# Altium footprint library ref-packages-longpad.PCBLIB: 1527 footprints (part 77 of 103) (continued)
## SQFP-S-14X14-100 [mm]
pads (100):
  rect 0.3x1.6 smd: 1(-6,-7.6) 2(-5.5,-7.6) 3(-5,-7.6) 4(-4.5,-7.6) 5(-4,-7.6) 6(-3.5,-7.6) 7(-3,-7.6) 8(-2.5,-7.6) 9(-2,-7.6) 10(-1.5,-7.6) 11(-1,-7.6) 12(-0.5,-7.6) 13(0,-7.6) 14(0.5,-7.6) 15(1,-7.6) 16(1.5,-7.6) 17(2,-7.6) 18(2.5,-7.6) 19(3,-7.6) 20(3.5,-7.6) 21(4,-7.6) 22(4.5,-7.6) 23(5,-7.6) 24(5.5,-7.6) 25(6,-7.6) 51(6,7.6) 52(5.5,7.6) 53(5,7.6) 54(4.5,7.6) 55(4,7.6) 56(3.5,7.6) 57(3,7.6) 58(2.5,7.6) 59(2,7.6) 60(1.5,7.6) 61(1,7.6) 62(0.5,7.6) 63(0,7.6) 64(-0.5,7.6) 65(-1,7.6) 66(-1.5,7.6) 67(-2,7.6) 68(-2.5,7.6) 69(-3,7.6) 70(-3.5,7.6) 71(-4,7.6) 72(-4.5,7.6) 73(-5,7.6) 74(-5.5,7.6) 75(-6,7.6)
  rect 1.6x0.3 smd: 26(7.6,-6) 27(7.6,-5.5) 28(7.6,-5) 29(7.6,-4.5) 30(7.6,-4) 31(7.6,-3.5) 32(7.6,-3) 33(7.6,-2.5) 34(7.6,-2) 35(7.6,-1.5) 36(7.6,-1) 37(7.6,-0.5) 38(7.6,0) 39(7.6,0.5) 40(7.6,1) 41(7.6,1.5) 42(7.6,2) 43(7.6,2.5) 44(7.6,3) 45(7.6,3.5) 46(7.6,4) 47(7.6,4.5) 48(7.6,5) 49(7.6,5.5) 50(7.6,6) 76(-7.6,6) 77(-7.6,5.5) 78(-7.6,5) 79(-7.6,4.5) 80(-7.6,4) 81(-7.6,3.5) 82(-7.6,3) 83(-7.6,2.5) 84(-7.6,2) 85(-7.6,1.5) 86(-7.6,1) 87(-7.6,0.5) 88(-7.6,0) 89(-7.6,-0.5) 90(-7.6,-1) 91(-7.6,-1.5) 92(-7.6,-2) 93(-7.6,-2.5) 94(-7.6,-3) 95(-7.6,-3.5) 96(-7.6,-4) 97(-7.6,-4.5) 98(-7.6,-5) 99(-7.6,-5.5) 100(-7.6,-6)
Top Overlay:
  circle w0.254: c-5.5,-5.5 r0.75
  lines w0.203: -6.72,-6.71 6.71,-6.71 6.71,6.71 -6.72,6.71 -6.72,-6.71
Mechanical 16:
  rectangle: -6.15,-7.9 -5.85,-6.95
  rectangle: -5.65,-7.9 -5.35,-6.95
  rectangle: -5.15,-7.9 -4.85,-6.95
  rectangle: -4.65,-7.9 -4.35,-6.95
  rectangle: -4.15,-7.9 -3.85,-6.95
  rectangle: -3.65,-7.9 -3.35,-6.95
  rectangle: -3.15,-7.9 -2.85,-6.95
  rectangle: -2.65,-7.9 -2.35,-6.95
  rectangle: -2.15,-7.9 -1.85,-6.95
  rectangle: -1.65,-7.9 -1.35,-6.95
  rectangle: -1.15,-7.9 -0.85,-6.95
  rectangle: -0.65,-7.9 -0.35,-6.95
  rectangle: -0.15,-7.9 0.15,-6.95
  rectangle: 0.35,-7.9 0.65,-6.95
  rectangle: 0.85,-7.9 1.15,-6.95
  rectangle: 1.35,-7.9 1.65,-6.95
  rectangle: 1.85,-7.9 2.15,-6.95
  rectangle: 2.35,-7.9 2.65,-6.95
  rectangle: 2.85,-7.9 3.15,-6.95
  rectangle: 3.35,-7.9 3.65,-6.95
  rectangle: 3.85,-7.9 4.15,-6.95
  rectangle: 4.35,-7.9 4.65,-6.95
  rectangle: 4.85,-7.9 5.15,-6.95
  rectangle: 5.35,-7.9 5.65,-6.95
  rectangle: 5.85,-7.9 6.15,-6.95
  rectangle: 6.95,-6.15 7.9,-5.85
  rectangle: 6.95,-5.65 7.9,-5.35
  rectangle: 6.95,-5.15 7.9,-4.85
  rectangle: 6.95,-4.65 7.9,-4.35
  rectangle: 6.95,-4.15 7.9,-3.85
  rectangle: 6.95,-3.65 7.9,-3.35
  rectangle: 6.95,-3.15 7.9,-2.85
  rectangle: 6.95,-2.65 7.9,-2.35
  rectangle: 6.95,-2.15 7.9,-1.85
  rectangle: 6.95,-1.65 7.9,-1.35
  rectangle: 6.95,-1.15 7.9,-0.85
  rectangle: 6.95,-0.65 7.9,-0.35
  rectangle: 6.95,-0.15 7.9,0.15
  rectangle: 6.95,0.35 7.9,0.65
  rectangle: 6.95,0.85 7.9,1.15
  rectangle: 6.95,1.35 7.9,1.65
  rectangle: 6.95,1.85 7.9,2.15
  rectangle: 6.95,2.35 7.9,2.65
  rectangle: 6.95,2.85 7.9,3.15
  rectangle: 6.95,3.35 7.9,3.65
  rectangle: 6.95,3.85 7.9,4.15
  rectangle: 6.95,4.35 7.9,4.65
  rectangle: 6.95,4.85 7.9,5.15
  rectangle: 6.95,5.35 7.9,5.65
  rectangle: 6.95,5.85 7.9,6.15
  rectangle: 5.85,6.95 6.15,7.9
  rectangle: 5.35,6.95 5.65,7.9
  rectangle: 4.85,6.95 5.15,7.9
  rectangle: 4.35,6.95 4.65,7.9
  rectangle: 3.85,6.95 4.15,7.9
  rectangle: 3.35,6.95 3.65,7.9
  rectangle: 2.85,6.95 3.15,7.9
  rectangle: 2.35,6.95 2.65,7.9
  rectangle: 1.85,6.95 2.15,7.9
  rectangle: 1.35,6.95 1.65,7.9
  rectangle: 0.85,6.95 1.15,7.9
  rectangle: 0.35,6.95 0.65,7.9
  rectangle: -0.15,6.95 0.15,7.9
  rectangle: -0.65,6.95 -0.35,7.9
  rectangle: -1.15,6.95 -0.85,7.9
  rectangle: -1.65,6.95 -1.35,7.9
  rectangle: -2.15,6.95 -1.85,7.9
  rectangle: -2.65,6.95 -2.35,7.9
  rectangle: -3.15,6.95 -2.85,7.9
  rectangle: -3.65,6.95 -3.35,7.9
  rectangle: -4.15,6.95 -3.85,7.9
  rectangle: -4.65,6.95 -4.35,7.9
  rectangle: -5.15,6.95 -4.85,7.9
  rectangle: -5.65,6.95 -5.35,7.9
  rectangle: -6.15,6.95 -5.85,7.9
  rectangle: -7.9,5.85 -6.95,6.15
  rectangle: -7.9,5.35 -6.95,5.65
  rectangle: -7.9,4.85 -6.95,5.15
  rectangle: -7.9,4.35 -6.95,4.65
  rectangle: -7.9,3.85 -6.95,4.15
  rectangle: -7.9,3.35 -6.95,3.65
  rectangle: -7.9,2.85 -6.95,3.15
  rectangle: -7.9,2.35 -6.95,2.65
  rectangle: -7.9,1.85 -6.95,2.15
  rectangle: -7.9,1.35 -6.95,1.65
  rectangle: -7.9,0.85 -6.95,1.15
  rectangle: -7.9,0.35 -6.95,0.65
  rectangle: -7.9,-0.15 -6.95,0.15
  rectangle: -7.9,-0.65 -6.95,-0.35
  rectangle: -7.9,-1.15 -6.95,-0.85
  rectangle: -7.9,-1.65 -6.95,-1.35
  rectangle: -7.9,-2.15 -6.95,-1.85
  rectangle: -7.9,-2.65 -6.95,-2.35
  rectangle: -7.9,-3.15 -6.95,-2.85
  rectangle: -7.9,-3.65 -6.95,-3.35
  rectangle: -7.9,-4.15 -6.95,-3.85
  rectangle: -7.9,-4.65 -6.95,-4.35
  rectangle: -7.9,-5.15 -6.95,-4.85
  rectangle: -7.9,-5.65 -6.95,-5.35
  rectangle: -7.9,-6.15 -6.95,-5.85
  lines w0.203: -6.91,-6.91 6.91,-6.91 6.91,6.91 -6.91,6.91 -6.91,-6.91
Mechanical 27:
  lines w0.2: -8.9,-8.9 -8.9,8.9 8.9,8.9 8.9,-8.9 -8.9,-8.9

## SQFP-S-14X14-108 [mm]
pads (108):
  rect 0.3x1.6 smd: 1(-6.5,-7.6) 2(-6,-7.6) 3(-5.5,-7.6) 4(-5,-7.6) 5(-4.5,-7.6) 6(-4,-7.6) 7(-3.5,-7.6) 8(-3,-7.6) 9(-2.5,-7.6) 10(-2,-7.6) 11(-1.5,-7.6) 12(-1,-7.6) 13(-0.5,-7.6) 14(0,-7.6) 15(0.5,-7.6) 16(1,-7.6) 17(1.5,-7.6) 18(2,-7.6) 19(2.5,-7.6) 20(3,-7.6) 21(3.5,-7.6) 22(4,-7.6) 23(4.5,-7.6) 24(5,-7.6) 25(5.5,-7.6) 26(6,-7.6) 27(6.5,-7.6) 55(6.5,7.6) 56(6,7.6) 57(5.5,7.6) 58(5,7.6) 59(4.5,7.6) 60(4,7.6) 61(3.5,7.6) 62(3,7.6) 63(2.5,7.6) 64(2,7.6) 65(1.5,7.6) 66(1,7.6) 67(0.5,7.6) 68(0,7.6) 69(-0.5,7.6) 70(-1,7.6) 71(-1.5,7.6) 72(-2,7.6) 73(-2.5,7.6) 74(-3,7.6) 75(-3.5,7.6) 76(-4,7.6) 77(-4.5,7.6) 78(-5,7.6) 79(-5.5,7.6) 80(-6,7.6) 81(-6.5,7.6)
  rect 1.6x0.3 smd: 28(7.6,-6.5) 29(7.6,-6) 30(7.6,-5.5) 31(7.6,-5) 32(7.6,-4.5) 33(7.6,-4) 34(7.6,-3.5) 35(7.6,-3) 36(7.6,-2.5) 37(7.6,-2) 38(7.6,-1.5) 39(7.6,-1) 40(7.6,-0.5) 41(7.6,0) 42(7.6,0.5) 43(7.6,1) 44(7.6,1.5) 45(7.6,2) 46(7.6,2.5) 47(7.6,3) 48(7.6,3.5) 49(7.6,4) 50(7.6,4.5) 51(7.6,5) 52(7.6,5.5) 53(7.6,6) 54(7.6,6.5) 82(-7.6,6.5) 83(-7.6,6) 84(-7.6,5.5) 85(-7.6,5) 86(-7.6,4.5) 87(-7.6,4) 88(-7.6,3.5) 89(-7.6,3) 90(-7.6,2.5) 91(-7.6,2) 92(-7.6,1.5) 93(-7.6,1) 94(-7.6,0.5) 95(-7.6,0) 96(-7.6,-0.5) 97(-7.6,-1) 98(-7.6,-1.5) 99(-7.6,-2) 100(-7.6,-2.5) 101(-7.6,-3) 102(-7.6,-3.5) 103(-7.6,-4) 104(-7.6,-4.5) 105(-7.6,-5) 106(-7.6,-5.5) 107(-7.6,-6) 108(-7.6,-6.5)
Top Overlay:
  circle w0.254: c-5.5,-5.5 r0.75
  lines w0.203: -6.72,-6.71 6.71,-6.71 6.71,6.71 -6.72,6.71 -6.72,-6.71
Mechanical 16:
  rectangle: -6.65,-7.9 -6.35,-6.95
  rectangle: -6.15,-7.9 -5.85,-6.95
  rectangle: -5.65,-7.9 -5.35,-6.95
  rectangle: -5.15,-7.9 -4.85,-6.95
  rectangle: -4.65,-7.9 -4.35,-6.95
  rectangle: -4.15,-7.9 -3.85,-6.95
  rectangle: -3.65,-7.9 -3.35,-6.95
  rectangle: -3.15,-7.9 -2.85,-6.95
  rectangle: -2.65,-7.9 -2.35,-6.95
  rectangle: -2.15,-7.9 -1.85,-6.95
  rectangle: -1.65,-7.9 -1.35,-6.95
  rectangle: -1.15,-7.9 -0.85,-6.95
  rectangle: -0.65,-7.9 -0.35,-6.95
  rectangle: -0.15,-7.9 0.15,-6.95
  rectangle: 0.35,-7.9 0.65,-6.95
  rectangle: 0.85,-7.9 1.15,-6.95
  rectangle: 1.35,-7.9 1.65,-6.95
  rectangle: 1.85,-7.9 2.15,-6.95
  rectangle: 2.35,-7.9 2.65,-6.95
  rectangle: 2.85,-7.9 3.15,-6.95
  rectangle: 3.35,-7.9 3.65,-6.95
  rectangle: 3.85,-7.9 4.15,-6.95
  rectangle: 4.35,-7.9 4.65,-6.95
  rectangle: 4.85,-7.9 5.15,-6.95
  rectangle: 5.35,-7.9 5.65,-6.95
  rectangle: 5.85,-7.9 6.15,-6.95
  rectangle: 6.35,-7.9 6.65,-6.95
  rectangle: 6.95,-6.65 7.9,-6.35
  rectangle: 6.95,-6.15 7.9,-5.85
  rectangle: 6.95,-5.65 7.9,-5.35
  rectangle: 6.95,-5.15 7.9,-4.85
  rectangle: 6.95,-4.65 7.9,-4.35
  rectangle: 6.95,-4.15 7.9,-3.85
  rectangle: 6.95,-3.65 7.9,-3.35
  rectangle: 6.95,-3.15 7.9,-2.85
  rectangle: 6.95,-2.65 7.9,-2.35
  rectangle: 6.95,-2.15 7.9,-1.85
  rectangle: 6.95,-1.65 7.9,-1.35
  rectangle: 6.95,-1.15 7.9,-0.85
  rectangle: 6.95,-0.65 7.9,-0.35
  rectangle: 6.95,-0.15 7.9,0.15
  rectangle: 6.95,0.35 7.9,0.65
  rectangle: 6.95,0.85 7.9,1.15
  rectangle: 6.95,1.35 7.9,1.65
  rectangle: 6.95,1.85 7.9,2.15
  rectangle: 6.95,2.35 7.9,2.65
  rectangle: 6.95,2.85 7.9,3.15
  rectangle: 6.95,3.35 7.9,3.65
  rectangle: 6.95,3.85 7.9,4.15
  rectangle: 6.95,4.35 7.9,4.65
  rectangle: 6.95,4.85 7.9,5.15
  rectangle: 6.95,5.35 7.9,5.65
  rectangle: 6.95,5.85 7.9,6.15
  rectangle: 6.95,6.35 7.9,6.65
  rectangle: 6.35,6.95 6.65,7.9
  rectangle: 5.85,6.95 6.15,7.9
  rectangle: 5.35,6.95 5.65,7.9
  rectangle: 4.85,6.95 5.15,7.9
  rectangle: 4.35,6.95 4.65,7.9
  rectangle: 3.85,6.95 4.15,7.9
  rectangle: 3.35,6.95 3.65,7.9
  rectangle: 2.85,6.95 3.15,7.9
  rectangle: 2.35,6.95 2.65,7.9
  rectangle: 1.85,6.95 2.15,7.9
  rectangle: 1.35,6.95 1.65,7.9
  rectangle: 0.85,6.95 1.15,7.9
  rectangle: 0.35,6.95 0.65,7.9
  rectangle: -0.15,6.95 0.15,7.9
  rectangle: -0.65,6.95 -0.35,7.9
  rectangle: -1.15,6.95 -0.85,7.9
  rectangle: -1.65,6.95 -1.35,7.9
  rectangle: -2.15,6.95 -1.85,7.9
  rectangle: -2.65,6.95 -2.35,7.9
  rectangle: -3.15,6.95 -2.85,7.9
  rectangle: -3.65,6.95 -3.35,7.9
  rectangle: -4.15,6.95 -3.85,7.9
  rectangle: -4.65,6.95 -4.35,7.9
  rectangle: -5.15,6.95 -4.85,7.9
  rectangle: -5.65,6.95 -5.35,7.9
  rectangle: -6.15,6.95 -5.85,7.9
  rectangle: -6.65,6.95 -6.35,7.9
  rectangle: -7.9,6.35 -6.95,6.65
  rectangle: -7.9,5.85 -6.95,6.15
  rectangle: -7.9,5.35 -6.95,5.65
  rectangle: -7.9,4.85 -6.95,5.15
  rectangle: -7.9,4.35 -6.95,4.65
  rectangle: -7.9,3.85 -6.95,4.15
  rectangle: -7.9,3.35 -6.95,3.65
  rectangle: -7.9,2.85 -6.95,3.15
  rectangle: -7.9,2.35 -6.95,2.65
  rectangle: -7.9,1.85 -6.95,2.15
  rectangle: -7.9,1.35 -6.95,1.65
  rectangle: -7.9,0.85 -6.95,1.15
  rectangle: -7.9,0.35 -6.95,0.65
  rectangle: -7.9,-0.15 -6.95,0.15
  rectangle: -7.9,-0.65 -6.95,-0.35
  rectangle: -7.9,-1.15 -6.95,-0.85
  rectangle: -7.9,-1.65 -6.95,-1.35
  rectangle: -7.9,-2.15 -6.95,-1.85
  rectangle: -7.9,-2.65 -6.95,-2.35
  rectangle: -7.9,-3.15 -6.95,-2.85
  rectangle: -7.9,-3.65 -6.95,-3.35
  rectangle: -7.9,-4.15 -6.95,-3.85
  rectangle: -7.9,-4.65 -6.95,-4.35
  rectangle: -7.9,-5.15 -6.95,-4.85
  rectangle: -7.9,-5.65 -6.95,-5.35
  rectangle: -7.9,-6.15 -6.95,-5.85
  rectangle: -7.9,-6.65 -6.95,-6.35
  lines w0.203: -6.91,-6.91 6.91,-6.91 6.91,6.91 -6.91,6.91 -6.91,-6.91
Mechanical 27:
  lines w0.2: -8.9,-8.9 -8.9,8.9 8.9,8.9 8.9,-8.9 -8.9,-8.9

## SQFP-S-14X14-120 [mm]
pads (120):
  rect 0.25x1.6 smd: 1(-5.8,-7.6) 2(-5.4,-7.6) 3(-5,-7.6) 4(-4.6,-7.6) 5(-4.2,-7.6) 6(-3.8,-7.6) 7(-3.4,-7.6) 8(-3,-7.6) 9(-2.6,-7.6) 10(-2.2,-7.6) 11(-1.8,-7.6) 12(-1.4,-7.6) 13(-1,-7.6) 14(-0.6,-7.6) 15(-0.2,-7.6) 16(0.2,-7.6) 17(0.6,-7.6) 18(1,-7.6) 19(1.4,-7.6) 20(1.8,-7.6) 21(2.2,-7.6) 22(2.6,-7.6) 23(3,-7.6) 24(3.4,-7.6) 25(3.8,-7.6) 26(4.2,-7.6) 27(4.6,-7.6) 28(5,-7.6) 29(5.4,-7.6) 30(5.8,-7.6) 61(5.8,7.6) 62(5.4,7.6) 63(5,7.6) 64(4.6,7.6) 65(4.2,7.6) 66(3.8,7.6) 67(3.4,7.6) 68(3,7.6) 69(2.6,7.6) 70(2.2,7.6) 71(1.8,7.6) 72(1.4,7.6) 73(1,7.6) 74(0.6,7.6) 75(0.2,7.6) 76(-0.2,7.6) 77(-0.6,7.6) 78(-1,7.6) 79(-1.4,7.6) 80(-1.8,7.6) 81(-2.2,7.6) 82(-2.6,7.6) 83(-3,7.6) 84(-3.4,7.6) 85(-3.8,7.6) 86(-4.2,7.6) 87(-4.6,7.6) 88(-5,7.6) 89(-5.4,7.6) 90(-5.8,7.6)
  rect 1.6x0.25 smd: 31(7.6,-5.8) 32(7.6,-5.4) 33(7.6,-5) 34(7.6,-4.6) 35(7.6,-4.2) 36(7.6,-3.8) 37(7.6,-3.4) 38(7.6,-3) 39(7.6,-2.6) 40(7.6,-2.2) 41(7.6,-1.8) 42(7.6,-1.4) 43(7.6,-1) 44(7.6,-0.6) 45(7.6,-0.2) 46(7.6,0.2) 47(7.6,0.6) 48(7.6,1) 49(7.6,1.4) 50(7.6,1.8) 51(7.6,2.2) 52(7.6,2.6) 53(7.6,3) 54(7.6,3.4) 55(7.6,3.8) 56(7.6,4.2) 57(7.6,4.6) 58(7.6,5) 59(7.6,5.4) 60(7.6,5.8) 91(-7.6,5.8) 92(-7.6,5.4) 93(-7.6,5) 94(-7.6,4.6) 95(-7.6,4.2) 96(-7.6,3.8) 97(-7.6,3.4) 98(-7.6,3) 99(-7.6,2.6) 100(-7.6,2.2) 101(-7.6,1.8) 102(-7.6,1.4) 103(-7.6,1) 104(-7.6,0.6) 105(-7.6,0.2) 106(-7.6,-0.2) 107(-7.6,-0.6) 108(-7.6,-1) 109(-7.6,-1.4) 110(-7.6,-1.8) 111(-7.6,-2.2) 112(-7.6,-2.6) 113(-7.6,-3) 114(-7.6,-3.4) 115(-7.6,-3.8) 116(-7.6,-4.2) 117(-7.6,-4.6) 118(-7.6,-5) 119(-7.6,-5.4) 120(-7.6,-5.8)
Top Overlay:
  circle w0.254: c-5.5,-5.5 r0.75
  lines w0.203: -6.72,-6.71 6.71,-6.71 6.71,6.71 -6.72,6.71 -6.72,-6.71
Mechanical 16:
  rectangle: -5.91,-7.9 -5.69,-6.95
  rectangle: -5.51,-7.9 -5.29,-6.95
  rectangle: -5.11,-7.9 -4.89,-6.95
  rectangle: -4.71,-7.9 -4.49,-6.95
  rectangle: -4.31,-7.9 -4.09,-6.95
  rectangle: -3.91,-7.9 -3.69,-6.95
  rectangle: -3.51,-7.9 -3.29,-6.95
  rectangle: -3.11,-7.9 -2.89,-6.95
  rectangle: -2.71,-7.9 -2.49,-6.95
  rectangle: -2.31,-7.9 -2.09,-6.95
  rectangle: -1.91,-7.9 -1.69,-6.95
  rectangle: -1.51,-7.9 -1.29,-6.95
  rectangle: -1.11,-7.9 -0.89,-6.95
  rectangle: -0.71,-7.9 -0.49,-6.95
  rectangle: -0.31,-7.9 -0.09,-6.95
  rectangle: 0.09,-7.9 0.31,-6.95
  rectangle: 0.49,-7.9 0.71,-6.95
  rectangle: 0.89,-7.9 1.11,-6.95
  rectangle: 1.29,-7.9 1.51,-6.95
  rectangle: 1.69,-7.9 1.91,-6.95
  rectangle: 2.09,-7.9 2.31,-6.95
  rectangle: 2.49,-7.9 2.71,-6.95
  rectangle: 2.89,-7.9 3.11,-6.95
  rectangle: 3.29,-7.9 3.51,-6.95
  rectangle: 3.69,-7.9 3.91,-6.95
  rectangle: 4.09,-7.9 4.31,-6.95
  rectangle: 4.49,-7.9 4.71,-6.95
  rectangle: 4.89,-7.9 5.11,-6.95
  rectangle: 5.29,-7.9 5.51,-6.95
  rectangle: 5.69,-7.9 5.91,-6.95
  rectangle: 6.95,-5.91 7.9,-5.69
  rectangle: 6.95,-5.51 7.9,-5.29
  rectangle: 6.95,-5.11 7.9,-4.89
  rectangle: 6.95,-4.71 7.9,-4.49
  rectangle: 6.95,-4.31 7.9,-4.09
  rectangle: 6.95,-3.91 7.9,-3.69
  rectangle: 6.95,-3.51 7.9,-3.29
  rectangle: 6.95,-3.11 7.9,-2.89
  rectangle: 6.95,-2.71 7.9,-2.49
  rectangle: 6.95,-2.31 7.9,-2.09
  rectangle: 6.95,-1.91 7.9,-1.69
  rectangle: 6.95,-1.51 7.9,-1.29
  rectangle: 6.95,-1.11 7.9,-0.89
  rectangle: 6.95,-0.71 7.9,-0.49
  rectangle: 6.95,-0.31 7.9,-0.09
  rectangle: 6.95,0.09 7.9,0.31
  rectangle: 6.95,0.49 7.9,0.71
  rectangle: 6.95,0.89 7.9,1.11
  rectangle: 6.95,1.29 7.9,1.51
  rectangle: 6.95,1.69 7.9,1.91
  rectangle: 6.95,2.09 7.9,2.31
  rectangle: 6.95,2.49 7.9,2.71
  rectangle: 6.95,2.89 7.9,3.11
  rectangle: 6.95,3.29 7.9,3.51
  rectangle: 6.95,3.69 7.9,3.91
  rectangle: 6.95,4.09 7.9,4.31
  rectangle: 6.95,4.49 7.9,4.71
  rectangle: 6.95,4.89 7.9,5.11
  rectangle: 6.95,5.29 7.9,5.51
  rectangle: 6.95,5.69 7.9,5.91
  rectangle: 5.69,6.95 5.91,7.9
  rectangle: 5.29,6.95 5.51,7.9
  rectangle: 4.89,6.95 5.11,7.9
  rectangle: 4.49,6.95 4.71,7.9
  rectangle: 4.09,6.95 4.31,7.9
  rectangle: 3.69,6.95 3.91,7.9
  rectangle: 3.29,6.95 3.51,7.9
  rectangle: 2.89,6.95 3.11,7.9
  rectangle: 2.49,6.95 2.71,7.9
  rectangle: 2.09,6.95 2.31,7.9
  rectangle: 1.69,6.95 1.91,7.9
  rectangle: 1.29,6.95 1.51,7.9
  rectangle: 0.89,6.95 1.11,7.9
  rectangle: 0.49,6.95 0.71,7.9
  rectangle: 0.09,6.95 0.31,7.9
  rectangle: -0.31,6.95 -0.09,7.9
  rectangle: -0.71,6.95 -0.49,7.9
  rectangle: -1.11,6.95 -0.89,7.9
  rectangle: -1.51,6.95 -1.29,7.9
  rectangle: -1.91,6.95 -1.69,7.9
  rectangle: -2.31,6.95 -2.09,7.9
  rectangle: -2.71,6.95 -2.49,7.9
  rectangle: -3.11,6.95 -2.89,7.9
  rectangle: -3.51,6.95 -3.29,7.9
  rectangle: -3.91,6.95 -3.69,7.9
  rectangle: -4.31,6.95 -4.09,7.9
  rectangle: -4.71,6.95 -4.49,7.9
  rectangle: -5.11,6.95 -4.89,7.9
  rectangle: -5.51,6.95 -5.29,7.9
  rectangle: -5.91,6.95 -5.69,7.9
  rectangle: -7.9,5.69 -6.95,5.91
  rectangle: -7.9,5.29 -6.95,5.51
  rectangle: -7.9,4.89 -6.95,5.11
  rectangle: -7.9,4.49 -6.95,4.71
  rectangle: -7.9,4.09 -6.95,4.31
  rectangle: -7.9,3.69 -6.95,3.91
  rectangle: -7.9,3.29 -6.95,3.51
  rectangle: -7.9,2.89 -6.95,3.11
  rectangle: -7.9,2.49 -6.95,2.71
  rectangle: -7.9,2.09 -6.95,2.31
  rectangle: -7.9,1.69 -6.95,1.91
  rectangle: -7.9,1.29 -6.95,1.51
  rectangle: -7.9,0.89 -6.95,1.11
  rectangle: -7.9,0.49 -6.95,0.71
  rectangle: -7.9,0.09 -6.95,0.31
  rectangle: -7.9,-0.31 -6.95,-0.09
  rectangle: -7.9,-0.71 -6.95,-0.49
  rectangle: -7.9,-1.11 -6.95,-0.89
  rectangle: -7.9,-1.51 -6.95,-1.29
  rectangle: -7.9,-1.91 -6.95,-1.69
  rectangle: -7.9,-2.31 -6.95,-2.09
  rectangle: -7.9,-2.71 -6.95,-2.49
  rectangle: -7.9,-3.11 -6.95,-2.89
  rectangle: -7.9,-3.51 -6.95,-3.29
  rectangle: -7.9,-3.91 -6.95,-3.69
  rectangle: -7.9,-4.31 -6.95,-4.09
  rectangle: -7.9,-4.71 -6.95,-4.49
  rectangle: -7.9,-5.11 -6.95,-4.89
  rectangle: -7.9,-5.51 -6.95,-5.29
  rectangle: -7.9,-5.91 -6.95,-5.69
  lines w0.203: -6.91,-6.91 6.91,-6.91 6.91,6.91 -6.91,6.91 -6.91,-6.91
Mechanical 27:
  lines w0.2: -8.9,-8.9 -8.9,8.9 8.9,8.9 8.9,-8.9 -8.9,-8.9

## SQFP-S-14X14-128 [mm]
pads (128):
  rect 0.25x1.6 smd: 1(-6.2,-7.6) 2(-5.8,-7.6) 3(-5.4,-7.6) 4(-5,-7.6) 5(-4.6,-7.6) 6(-4.2,-7.6) 7(-3.8,-7.6) 8(-3.4,-7.6) 9(-3,-7.6) 10(-2.6,-7.6) 11(-2.2,-7.6) 12(-1.8,-7.6) 13(-1.4,-7.6) 14(-1,-7.6) 15(-0.6,-7.6) 16(-0.2,-7.6) 17(0.2,-7.6) 18(0.6,-7.6) 19(1,-7.6) 20(1.4,-7.6) 21(1.8,-7.6) 22(2.2,-7.6) 23(2.6,-7.6) 24(3,-7.6) 25(3.4,-7.6) 26(3.8,-7.6) 27(4.2,-7.6) 28(4.6,-7.6) 29(5,-7.6) 30(5.4,-7.6) 31(5.8,-7.6) 32(6.2,-7.6) 65(6.2,7.6) 66(5.8,7.6) 67(5.4,7.6) 68(5,7.6) 69(4.6,7.6) 70(4.2,7.6) 71(3.8,7.6) 72(3.4,7.6) 73(3,7.6) 74(2.6,7.6) 75(2.2,7.6) 76(1.8,7.6) 77(1.4,7.6) 78(1,7.6) 79(0.6,7.6) 80(0.2,7.6) 81(-0.2,7.6) 82(-0.6,7.6) 83(-1,7.6) 84(-1.4,7.6) 85(-1.8,7.6) 86(-2.2,7.6) 87(-2.6,7.6) 88(-3,7.6) 89(-3.4,7.6) 90(-3.8,7.6) 91(-4.2,7.6) 92(-4.6,7.6) 93(-5,7.6) 94(-5.4,7.6) 95(-5.8,7.6) 96(-6.2,7.6)
  rect 1.6x0.25 smd: 33(7.6,-6.2) 34(7.6,-5.8) 35(7.6,-5.4) 36(7.6,-5) 37(7.6,-4.6) 38(7.6,-4.2) 39(7.6,-3.8) 40(7.6,-3.4) 41(7.6,-3) 42(7.6,-2.6) 43(7.6,-2.2) 44(7.6,-1.8) 45(7.6,-1.4) 46(7.6,-1) 47(7.6,-0.6) 48(7.6,-0.2) 49(7.6,0.2) 50(7.6,0.6) 51(7.6,1) 52(7.6,1.4) 53(7.6,1.8) 54(7.6,2.2) 55(7.6,2.6) 56(7.6,3) 57(7.6,3.4) 58(7.6,3.8) 59(7.6,4.2) 60(7.6,4.6) 61(7.6,5) 62(7.6,5.4) 63(7.6,5.8) 64(7.6,6.2) 97(-7.6,6.2) 98(-7.6,5.8) 99(-7.6,5.4) 100(-7.6,5) 101(-7.6,4.6) 102(-7.6,4.2) 103(-7.6,3.8) 104(-7.6,3.4) 105(-7.6,3) 106(-7.6,2.6) 107(-7.6,2.2) 108(-7.6,1.8) 109(-7.6,1.4) 110(-7.6,1) 111(-7.6,0.6) 112(-7.6,0.2) 113(-7.6,-0.2) 114(-7.6,-0.6) 115(-7.6,-1) 116(-7.6,-1.4) 117(-7.6,-1.8) 118(-7.6,-2.2) 119(-7.6,-2.6) 120(-7.6,-3) 121(-7.6,-3.4) 122(-7.6,-3.8) 123(-7.6,-4.2) 124(-7.6,-4.6) 125(-7.6,-5) 126(-7.6,-5.4) 127(-7.6,-5.8) 128(-7.6,-6.2)
Top Overlay:
  circle w0.254: c-5.5,-5.5 r0.75
  lines w0.203: -6.72,-6.71 6.71,-6.71 6.71,6.71 -6.72,6.71 -6.72,-6.71
Mechanical 16:
  rectangle: -6.31,-7.9 -6.09,-6.95
  rectangle: -5.91,-7.9 -5.69,-6.95
  rectangle: -5.51,-7.9 -5.29,-6.95
  rectangle: -5.11,-7.9 -4.89,-6.95
  rectangle: -4.71,-7.9 -4.49,-6.95
  rectangle: -4.31,-7.9 -4.09,-6.95
  rectangle: -3.91,-7.9 -3.69,-6.95
  rectangle: -3.51,-7.9 -3.29,-6.95
  rectangle: -3.11,-7.9 -2.89,-6.95
  rectangle: -2.71,-7.9 -2.49,-6.95
  rectangle: -2.31,-7.9 -2.09,-6.95
  rectangle: -1.91,-7.9 -1.69,-6.95
  rectangle: -1.51,-7.9 -1.29,-6.95
  rectangle: -1.11,-7.9 -0.89,-6.95
  rectangle: -0.71,-7.9 -0.49,-6.95
  rectangle: -0.31,-7.9 -0.09,-6.95
  rectangle: 0.09,-7.9 0.31,-6.95
  rectangle: 0.49,-7.9 0.71,-6.95
  rectangle: 0.89,-7.9 1.11,-6.95
  rectangle: 1.29,-7.9 1.51,-6.95
  rectangle: 1.69,-7.9 1.91,-6.95
  rectangle: 2.09,-7.9 2.31,-6.95
  rectangle: 2.49,-7.9 2.71,-6.95
  rectangle: 2.89,-7.9 3.11,-6.95
  rectangle: 3.29,-7.9 3.51,-6.95
  rectangle: 3.69,-7.9 3.91,-6.95
  rectangle: 4.09,-7.9 4.31,-6.95
  rectangle: 4.49,-7.9 4.71,-6.95
  rectangle: 4.89,-7.9 5.11,-6.95
  rectangle: 5.29,-7.9 5.51,-6.95
  rectangle: 5.69,-7.9 5.91,-6.95
  rectangle: 6.09,-7.9 6.31,-6.95
  rectangle: 6.95,-6.31 7.9,-6.09
  rectangle: 6.95,-5.91 7.9,-5.69
  rectangle: 6.95,-5.51 7.9,-5.29
  rectangle: 6.95,-5.11 7.9,-4.89
  rectangle: 6.95,-4.71 7.9,-4.49
  rectangle: 6.95,-4.31 7.9,-4.09
  rectangle: 6.95,-3.91 7.9,-3.69
  rectangle: 6.95,-3.51 7.9,-3.29
  rectangle: 6.95,-3.11 7.9,-2.89
  rectangle: 6.95,-2.71 7.9,-2.49
  rectangle: 6.95,-2.31 7.9,-2.09
  rectangle: 6.95,-1.91 7.9,-1.69
  rectangle: 6.95,-1.51 7.9,-1.29
  rectangle: 6.95,-1.11 7.9,-0.89
  rectangle: 6.95,-0.71 7.9,-0.49
  rectangle: 6.95,-0.31 7.9,-0.09
  rectangle: 6.95,0.09 7.9,0.31
  rectangle: 6.95,0.49 7.9,0.71
  rectangle: 6.95,0.89 7.9,1.11
  rectangle: 6.95,1.29 7.9,1.51
  rectangle: 6.95,1.69 7.9,1.91
  rectangle: 6.95,2.09 7.9,2.31
  rectangle: 6.95,2.49 7.9,2.71
  rectangle: 6.95,2.89 7.9,3.11
  rectangle: 6.95,3.29 7.9,3.51
  rectangle: 6.95,3.69 7.9,3.91
  rectangle: 6.95,4.09 7.9,4.31
  rectangle: 6.95,4.49 7.9,4.71
  rectangle: 6.95,4.89 7.9,5.11
  rectangle: 6.95,5.29 7.9,5.51
  rectangle: 6.95,5.69 7.9,5.91
  rectangle: 6.95,6.09 7.9,6.31
  rectangle: 6.09,6.95 6.31,7.9
  rectangle: 5.69,6.95 5.91,7.9
  rectangle: 5.29,6.95 5.51,7.9
  rectangle: 4.89,6.95 5.11,7.9
  rectangle: 4.49,6.95 4.71,7.9
  rectangle: 4.09,6.95 4.31,7.9
  rectangle: 3.69,6.95 3.91,7.9
  rectangle: 3.29,6.95 3.51,7.9
  rectangle: 2.89,6.95 3.11,7.9
  rectangle: 2.49,6.95 2.71,7.9
  rectangle: 2.09,6.95 2.31,7.9
  rectangle: 1.69,6.95 1.91,7.9
  rectangle: 1.29,6.95 1.51,7.9
  rectangle: 0.89,6.95 1.11,7.9
  rectangle: 0.49,6.95 0.71,7.9
  rectangle: 0.09,6.95 0.31,7.9
  rectangle: -0.31,6.95 -0.09,7.9
  rectangle: -0.71,6.95 -0.49,7.9
  rectangle: -1.11,6.95 -0.89,7.9
  rectangle: -1.51,6.95 -1.29,7.9
  rectangle: -1.91,6.95 -1.69,7.9
  rectangle: -2.31,6.95 -2.09,7.9
  rectangle: -2.71,6.95 -2.49,7.9
  rectangle: -3.11,6.95 -2.89,7.9
  rectangle: -3.51,6.95 -3.29,7.9
  rectangle: -3.91,6.95 -3.69,7.9
  rectangle: -4.31,6.95 -4.09,7.9
  rectangle: -4.71,6.95 -4.49,7.9
  rectangle: -5.11,6.95 -4.89,7.9
  rectangle: -5.51,6.95 -5.29,7.9
  rectangle: -5.91,6.95 -5.69,7.9
  rectangle: -6.31,6.95 -6.09,7.9
  rectangle: -7.9,6.09 -6.95,6.31
  rectangle: -7.9,5.69 -6.95,5.91
  rectangle: -7.9,5.29 -6.95,5.51
  rectangle: -7.9,4.89 -6.95,5.11
  rectangle: -7.9,4.49 -6.95,4.71
  rectangle: -7.9,4.09 -6.95,4.31
  rectangle: -7.9,3.69 -6.95,3.91
  rectangle: -7.9,3.29 -6.95,3.51
  rectangle: -7.9,2.89 -6.95,3.11
  rectangle: -7.9,2.49 -6.95,2.71
  rectangle: -7.9,2.09 -6.95,2.31
  rectangle: -7.9,1.69 -6.95,1.91
  rectangle: -7.9,1.29 -6.95,1.51
  rectangle: -7.9,0.89 -6.95,1.11
  rectangle: -7.9,0.49 -6.95,0.71
  rectangle: -7.9,0.09 -6.95,0.31
  rectangle: -7.9,-0.31 -6.95,-0.09
  rectangle: -7.9,-0.71 -6.95,-0.49
  rectangle: -7.9,-1.11 -6.95,-0.89
  rectangle: -7.9,-1.51 -6.95,-1.29
  rectangle: -7.9,-1.91 -6.95,-1.69
  rectangle: -7.9,-2.31 -6.95,-2.09
  rectangle: -7.9,-2.71 -6.95,-2.49
  rectangle: -7.9,-3.11 -6.95,-2.89
  rectangle: -7.9,-3.51 -6.95,-3.29
  rectangle: -7.9,-3.91 -6.95,-3.69
  rectangle: -7.9,-4.31 -6.95,-4.09
  rectangle: -7.9,-4.71 -6.95,-4.49
  rectangle: -7.9,-5.11 -6.95,-4.89
  rectangle: -7.9,-5.51 -6.95,-5.29
  rectangle: -7.9,-5.91 -6.95,-5.69
  rectangle: -7.9,-6.31 -6.95,-6.09
  lines w0.203: -6.91,-6.91 6.91,-6.91 6.91,6.91 -6.91,6.91 -6.91,-6.91
Mechanical 27:
  lines w0.2: -8.9,-8.9 -8.9,8.9 8.9,8.9 8.9,-8.9 -8.9,-8.9

## SQFP-S-14X14-168 [mm]
pads (168):
  rect 0.17x1.6 smd: 1(-6.15,-7.6) 2(-5.85,-7.6) 3(-5.55,-7.6) 4(-5.25,-7.6) 5(-4.95,-7.6) 6(-4.65,-7.6) 7(-4.35,-7.6) 8(-4.05,-7.6) 9(-3.75,-7.6) 10(-3.45,-7.6) 11(-3.15,-7.6) 12(-2.85,-7.6) 13(-2.55,-7.6) 14(-2.25,-7.6) 15(-1.95,-7.6) 16(-1.65,-7.6) 17(-1.35,-7.6) 18(-1.05,-7.6) 19(-0.75,-7.6) 20(-0.45,-7.6) 21(-0.15,-7.6) 22(0.15,-7.6) 23(0.45,-7.6) 24(0.75,-7.6) 25(1.05,-7.6) 26(1.35,-7.6) 27(1.65,-7.6) 28(1.95,-7.6) 29(2.25,-7.6) 30(2.55,-7.6) 31(2.85,-7.6) 32(3.15,-7.6) 33(3.45,-7.6) 34(3.75,-7.6) 35(4.05,-7.6) 36(4.35,-7.6) 37(4.65,-7.6) 38(4.95,-7.6) 39(5.25,-7.6) 40(5.55,-7.6) 41(5.85,-7.6) 42(6.15,-7.6) 85(6.15,7.6) 86(5.85,7.6) 87(5.55,7.6) 88(5.25,7.6) 89(4.95,7.6) 90(4.65,7.6) 91(4.35,7.6) 92(4.05,7.6) 93(3.75,7.6) 94(3.45,7.6) 95(3.15,7.6) 96(2.85,7.6) 97(2.55,7.6) 98(2.25,7.6) 99(1.95,7.6) 100(1.65,7.6) 101(1.35,7.6) 102(1.05,7.6) 103(0.75,7.6) 104(0.45,7.6) 105(0.15,7.6) 106(-0.15,7.6) 107(-0.45,7.6) 108(-0.75,7.6) 109(-1.05,7.6) 110(-1.35,7.6) 111(-1.65,7.6) 112(-1.95,7.6) 113(-2.25,7.6) 114(-2.55,7.6) 115(-2.85,7.6) 116(-3.15,7.6) 117(-3.45,7.6) 118(-3.75,7.6) 119(-4.05,7.6) 120(-4.35,7.6) 121(-4.65,7.6) 122(-4.95,7.6) 123(-5.25,7.6) 124(-5.55,7.6) 125(-5.85,7.6) 126(-6.15,7.6)
  rect 1.6x0.17 smd: 43(7.6,-6.15) 44(7.6,-5.85) 45(7.6,-5.55) 46(7.6,-5.25) 47(7.6,-4.95) 48(7.6,-4.65) 49(7.6,-4.35) 50(7.6,-4.05) 51(7.6,-3.75) 52(7.6,-3.45) 53(7.6,-3.15) 54(7.6,-2.85) 55(7.6,-2.55) 56(7.6,-2.25) 57(7.6,-1.95) 58(7.6,-1.65) 59(7.6,-1.35) 60(7.6,-1.05) 61(7.6,-0.75) 62(7.6,-0.45) 63(7.6,-0.15) 64(7.6,0.15) 65(7.6,0.45) 66(7.6,0.75) 67(7.6,1.05) 68(7.6,1.35) 69(7.6,1.65) 70(7.6,1.95) 71(7.6,2.25) 72(7.6,2.55) 73(7.6,2.85) 74(7.6,3.15) 75(7.6,3.45) 76(7.6,3.75) 77(7.6,4.05) 78(7.6,4.35) 79(7.6,4.65) 80(7.6,4.95) 81(7.6,5.25) 82(7.6,5.55) 83(7.6,5.85) 84(7.6,6.15) 127(-7.6,6.15) 128(-7.6,5.85) 129(-7.6,5.55) 130(-7.6,5.25) 131(-7.6,4.95) 132(-7.6,4.65) 133(-7.6,4.35) 134(-7.6,4.05) 135(-7.6,3.75) 136(-7.6,3.45) 137(-7.6,3.15) 138(-7.6,2.85) 139(-7.6,2.55) 140(-7.6,2.25) 141(-7.6,1.95) 142(-7.6,1.65) 143(-7.6,1.35) 144(-7.6,1.05) 145(-7.6,0.75) 146(-7.6,0.45) 147(-7.6,0.15) 148(-7.6,-0.15) 149(-7.6,-0.45) 150(-7.6,-0.75) 151(-7.6,-1.05) 152(-7.6,-1.35) 153(-7.6,-1.65) 154(-7.6,-1.95) 155(-7.6,-2.25) 156(-7.6,-2.55) 157(-7.6,-2.85) 158(-7.6,-3.15) 159(-7.6,-3.45) 160(-7.6,-3.75) 161(-7.6,-4.05) 162(-7.6,-4.35) 163(-7.6,-4.65) 164(-7.6,-4.95) 165(-7.6,-5.25) 166(-7.6,-5.55) 167(-7.6,-5.85) 168(-7.6,-6.15)
Top Overlay:
  circle w0.254: c-5.5,-5.5 r0.75
  lines w0.203: -6.72,-6.71 6.71,-6.71 6.71,6.71 -6.72,6.71 -6.72,-6.71
Mechanical 16:
  drawing of 172 lines, arcs and shapes, not listed
Mechanical 27:
  lines w0.2: -8.9,-8.9 -8.9,8.9 8.9,8.9 8.9,-8.9 -8.9,-8.9